# Altium footprint library andylib.PcbLib: 158 footprints (part 2 of 10)
Each footprint in its own frame and in the unit in brackets; x right, y up, seen from the top. Pads: shape width x height; smd on the part's side, far side on the other; paste and mask are expansions set on the pad; w line width, h text height; cw(c..) or ccw(c..) is an arc to the next point about the centre after c.
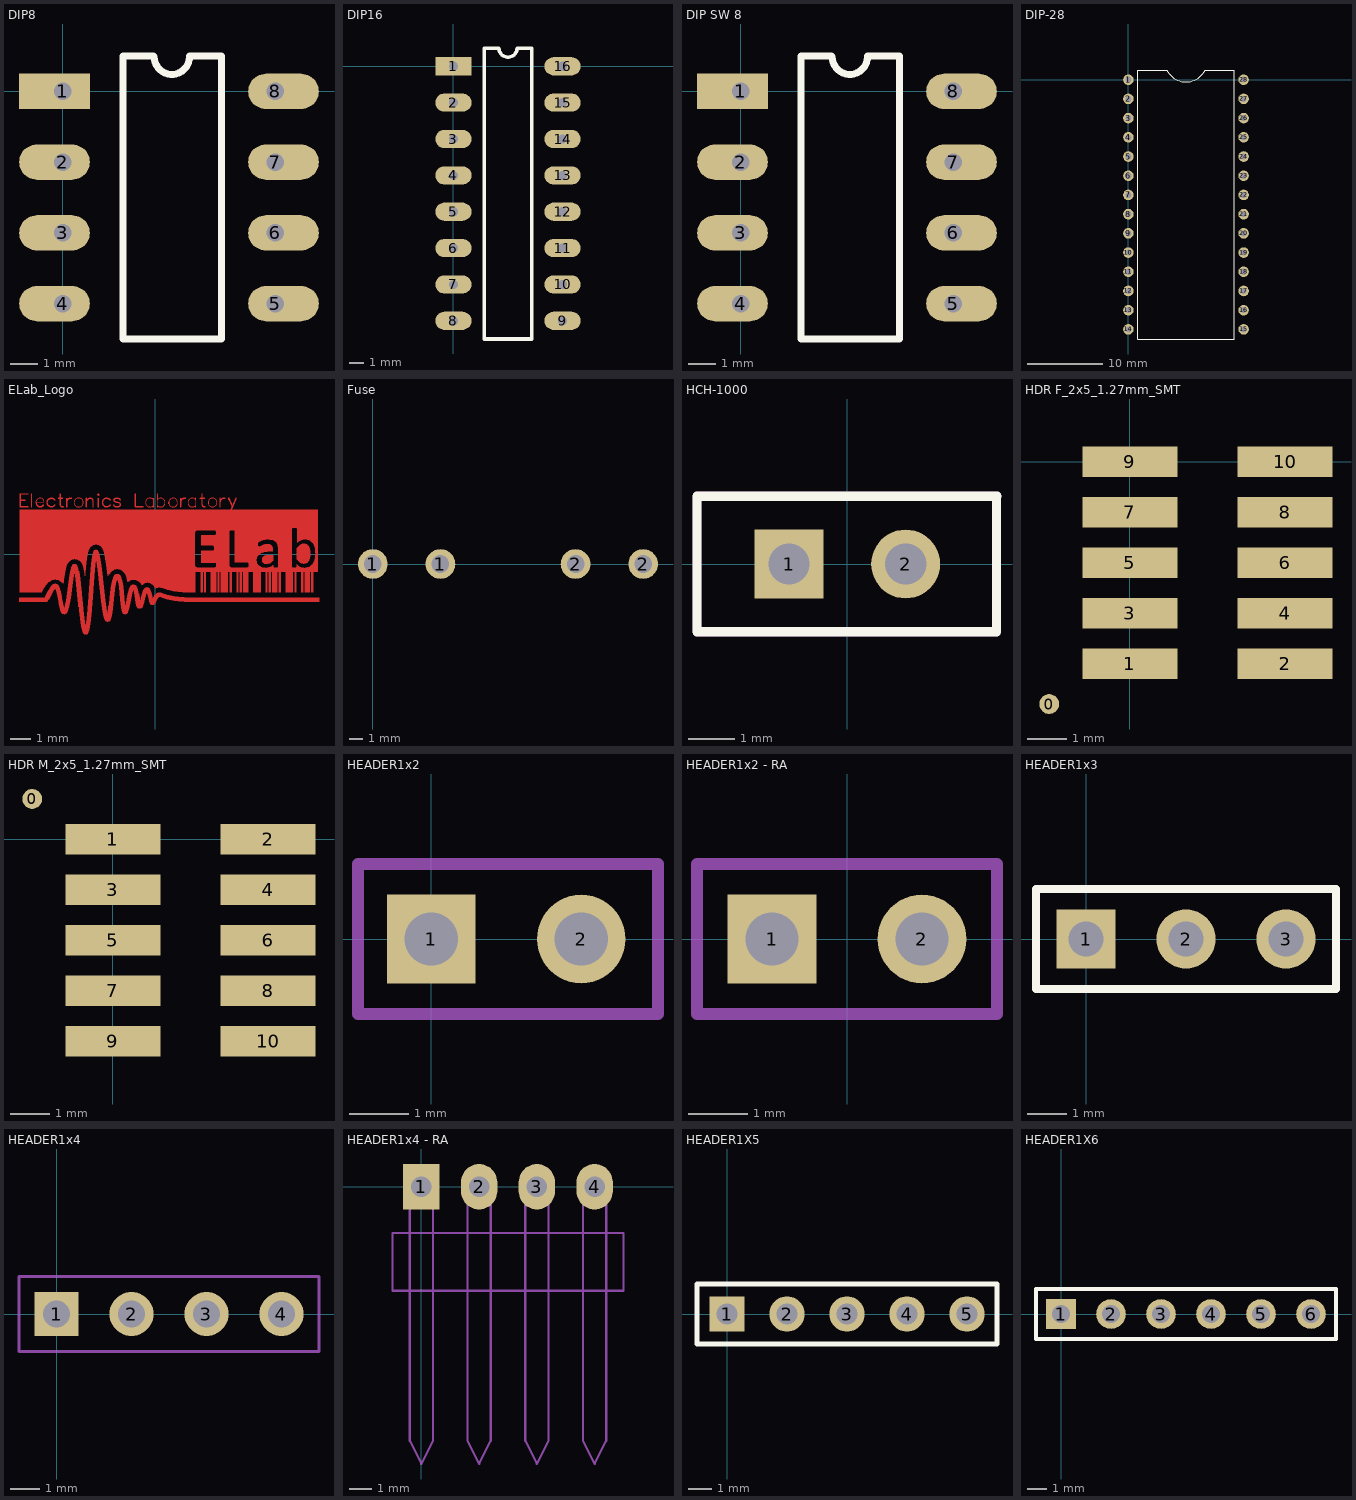
[diagram p1: the footprints below, top view; thin cyan lines are the x and y axes]

## DIP8 [mm]
pads (8):
  rect 2.54x1.27 hole 0.635 copper offset -0.3,0: 1(0,0)
  oval 2.54x1.27 hole 0.635 copper offset -0.3,0: 2(0,-2.54) 3(0,-5.08) 4(0,-7.62)
  oval 2.54x1.27 hole 0.635 copper offset 0.3,0: 5(7.62,-7.62) 6(7.62,-5.08) 7(7.62,-2.54) 8(7.62,0)
Top Overlay:
  lines w0.254: 3.251,1.27 2.159,1.27 2.159,-8.89 5.69,-8.89 5.69,1.27 ; 3.277,1.245 ccw(c3.912,1.245) 4.547,1.245 ; 4.547,1.27 5.639,1.27
3D body: height 8.36, standoff -4.46, extent -1.245,-8.763 8.814,1.295

## DIP16 [mm]
pads (16):
  rect 2.54x1.27 hole 0.635: 1(0,0)
  oval 2.54x1.27 hole 0.635: 2(0,-2.54) 3(0,-5.08) 4(0,-7.62) 5(0,-10.16) 6(0,-12.7) 7(0,-15.24) 8(0,-17.78) 9(7.62,-17.78) 10(7.62,-15.24) 11(7.62,-12.7) 12(7.62,-10.16) 13(7.62,-7.62) 14(7.62,-5.08) 15(7.62,-2.54) 16(7.62,0)
Top Overlay:
  lines w0.254: 2.159,-19.05 5.461,-19.05 5.461,1.27 4.445,1.27 cw(c3.81,1.27) 3.175,1.27 2.159,1.27 2.159,-19.05
3D body: height 8.06, standoff -2.87, extent -1.491,-19.111 9.009,1.295

## DIP SW 8 [mm]
pads (8):
  rect 2.54x1.27 hole 0.635 copper offset -0.3,0: 1(0,0)
  oval 2.54x1.27 hole 0.635 copper offset -0.3,0: 2(0,-2.54) 3(0,-5.08) 4(0,-7.62)
  oval 2.54x1.27 hole 0.635 copper offset 0.3,0: 5(7.62,-7.62) 6(7.62,-5.08) 7(7.62,-2.54) 8(7.62,0)
Top Overlay:
  lines w0.254: 3.251,1.27 2.159,1.27 2.159,-8.89 5.69,-8.89 5.69,1.27 ; 3.277,1.245 ccw(c3.912,1.245) 4.547,1.245 ; 4.547,1.27 5.639,1.27
3D body: height 3.95, standoff -0.25, extent -0.011,-8.916 7.609,1.244

## DIP-28 [mm] "DIP-28"
height 5.08
pads (28):
  round 1.4 hole 0.8: 1(0,0) 2(0,-2.54) 3(0,-5.08) 4(0,-7.62) 5(0,-10.16) 6(0,-12.7) 7(0,-15.24) 8(0,-17.78) 9(0,-20.32) 10(0,-22.86) 11(0,-25.4) 12(0,-27.94) 13(0,-30.48) 14(0,-33.02) 15(15.24,-33.02) 16(15.24,-30.48) 17(15.24,-27.94) 18(15.24,-25.4) 19(15.24,-22.86) 20(15.24,-20.32) 21(15.24,-17.78) 22(15.24,-15.24) 23(15.24,-12.7) 24(15.24,-10.16) 25(15.24,-7.62) 26(15.24,-5.08) 27(15.24,-2.54) 28(15.24,0)
Top Overlay:
  lines w0.102: 1.27,-34.29 13.97,-34.29 13.97,1.27 10.16,1.27 cw(c7.62,2.54) 5.08,1.27 1.27,1.27 1.27,-34.29
3D body: height 5.09, standoff -3.81, extent -0.075,-35.13 15.365,2.21

## ELab_Logo [mm]
Top Layer:
  drawing of 25 lines, arcs and shapes, not listed

## Fuse [mm] "Fuse holder with small fuse"
pads (4):
  round 2.2 hole 1.3: 1(0,0) 1(5,0) 2(15,0) 2(20,0)
3D body: height 9.56, standoff -3.34, extent -0.639,-3.1 20.639,3.09

## HCH-1000 [mm] "Capacitive Humidity Sensor"
height 10.18
pads (2):
  rect 1.5x1.5 hole 0.9: 1(-1.27,0)
  round 1.5 hole 0.9: 2(1.27,0)
Top Overlay:
  lines w0.2: -3.275,1.475 -3.275,-1.475 3.25,-1.475 3.25,1.475 ; -3.26,1.475 3.26,1.475
Mechanical 13:
  lines w0.2: -3.275,1.475 -3.275,-1.475 3.25,-1.475 3.25,1.475 ; -3.26,1.475 3.26,1.475
3D body: height 10.18, standoff 0, extent -3.375,-1.575 3.36,1.575

## HDR F_2x5_1.27mm_SMT [mm] "FEMALE 1.27mm SMT Header - Unshrouded"
pads (11):
  round 0.5 smd mask+0: 0(-2.032,-6.091)
  rect 2.4x0.76 smd: 1(0,-5.075) 2(3.9,-5.075) 3(0,-3.805) 4(3.9,-3.805) 5(0,-2.535) 6(3.9,-2.535) 7(0,-1.265) 8(3.9,-1.265) 9(0,0.005) 10(3.9,0.005)
3D body: height 4.5, standoff 0, extent -0.55,-5.7 4.45,0.65

## HDR M_2x5_1.27mm_SMT [mm]
pads (11):
  round 0.5 smd mask+0: 0(-2.032,1.016)
  rect 2.4x0.76 smd: 1(0,0) 2(3.9,0) 3(0,-1.27) 4(3.9,-1.27) 5(0,-2.54) 6(3.9,-2.54) 7(0,-3.81) 8(3.9,-3.81) 9(0,-5.08) 10(3.9,-5.08)
3D body: height 4.5, standoff 0, extent -0.794,-5.74 4.706,0.61

## HEADER1x2 [mm] "2.54mm Header"
pads (2):
  rect 1.5x1.5 hole 0.9: 1(0,0)
  round 1.5 hole 0.9: 2(2.54,0)
Mechanical 13:
  lines w0.2: -1.24,-1.27 -1.24,1.27 3.84,1.27 3.84,-1.27 -1.24,-1.27
3D body: height 8.44, standoff -2.54, extent -1.27,-1.27 3.81,1.27

## HEADER1x2 - RA [mm] "2.54mm Right Angle Header"
pads (2):
  rect 1.5x1.5 hole 0.9: 1(-1.27,0)
  round 1.5 hole 0.9: 2(1.27,0)
Mechanical 13:
  lines w0.2: -2.54,-1.27 -2.54,1.27 2.54,1.27 2.54,-1.27 -2.54,-1.27
3D body: height 8.44, standoff -2.54, extent -2.54,-1.27 2.54,1.27

## HEADER1x3 [mm] "Connector; Header; 3 Position"
pads (3):
  rect 1.5x1.5 hole 0.9: 1(0,0)
  round 1.5 hole 0.9: 2(2.54,0) 3(5.08,0)
Top Overlay:
  lines w0.2: -1.27,-1.27 6.35,-1.27 6.35,1.27 -1.27,1.27 -1.27,-1.27
3D body: height 8.43, standoff -2.55, extent -1.27,-1.27 6.35,1.27

## HEADER1x4 [mm] "Connector; Header; 4 Position"
pads (4):
  rect 1.5x1.5 hole 0.9: 1(0,0)
  round 1.5 hole 0.9: 2(2.54,0) 3(5.08,0) 4(7.62,0)
Mechanical 13:
  lines w0.1: -1.27,-1.27 -1.27,1.27 8.89,1.27 8.89,-1.27 -1.27,-1.27
3D body: height 8.43, standoff -2.55, extent -1.27,-1.27 8.89,1.27

## HEADER1x4 - RA [mm] "Connector; Header; Right Angle; 4 Position"
pads (4):
  rect 1.6x2 hole 0.9: 1(0,0)
  oval 1.6x2 hole 0.9: 2(2.54,0) 3(5.08,0) 4(7.62,0)
Mechanical 13:
  lines w0.1: -0.508,-0.508 -0.508,-11.176 0,-12.192 0.508,-11.176 0.508,-0.508 ; 2.032,-0.508 2.032,-11.176 2.54,-12.192 3.048,-11.176 3.048,-0.508 ; 4.572,-0.508 4.572,-11.176 5.08,-12.192 5.588,-11.176 5.588,-0.508 ; 7.112,-0.508 7.112,-11.176 7.62,-12.192 8.128,-11.176 8.128,-0.508 ; -1.27,-4.572 -1.27,-2.032 8.89,-2.032 8.89,-4.572 -1.27,-4.572
3D body: height 2.54, standoff -3, extent -1.245,-10.055 8.915,0.305

## HEADER1X5 [mm] "Connector; Header; 5 Position"
pads (5):
  rect 1.5x1.5 hole 0.9: 1(0,0)
  round 1.5 hole 0.9: 2(2.54,0) 3(5.08,0) 4(7.62,0) 5(10.16,0)
Top Overlay:
  lines w0.2: -1.27,-1.27 11.43,-1.27 11.43,1.27 -1.27,1.27 -1.27,-1.27
3D body: height 8.44, standoff -2.54, extent -1.25,-1.25 11.45,1.29

## HEADER1X6 [mm] "Connector; Header; 6 Position"
pads (6):
  rect 1.5x1.5 hole 0.9: 1(0,0)
  round 1.5 hole 0.9: 2(2.54,0) 3(5.08,0) 4(7.62,0) 5(10.16,0) 6(12.7,0)
Top Overlay:
  lines w0.2: -1.27,-1.27 -1.27,1.27 13.97,1.27 13.97,-1.27 -1.27,-1.27
3D body: height 8.44, standoff -2.54, extent -1.3,-1.25 13.94,1.29